# Altium footprint library HerosLib.PcbLib: 110 footprints (part 7 of 7)
Each footprint in its own frame and in the unit in brackets; x right, y up, seen from the top. Pads: shape width x height; smd on the part's side, far side on the other; paste and mask are expansions set on the pad; w line width, h text height; cw(c..) or ccw(c..) is an arc to the next point about the centre after c.
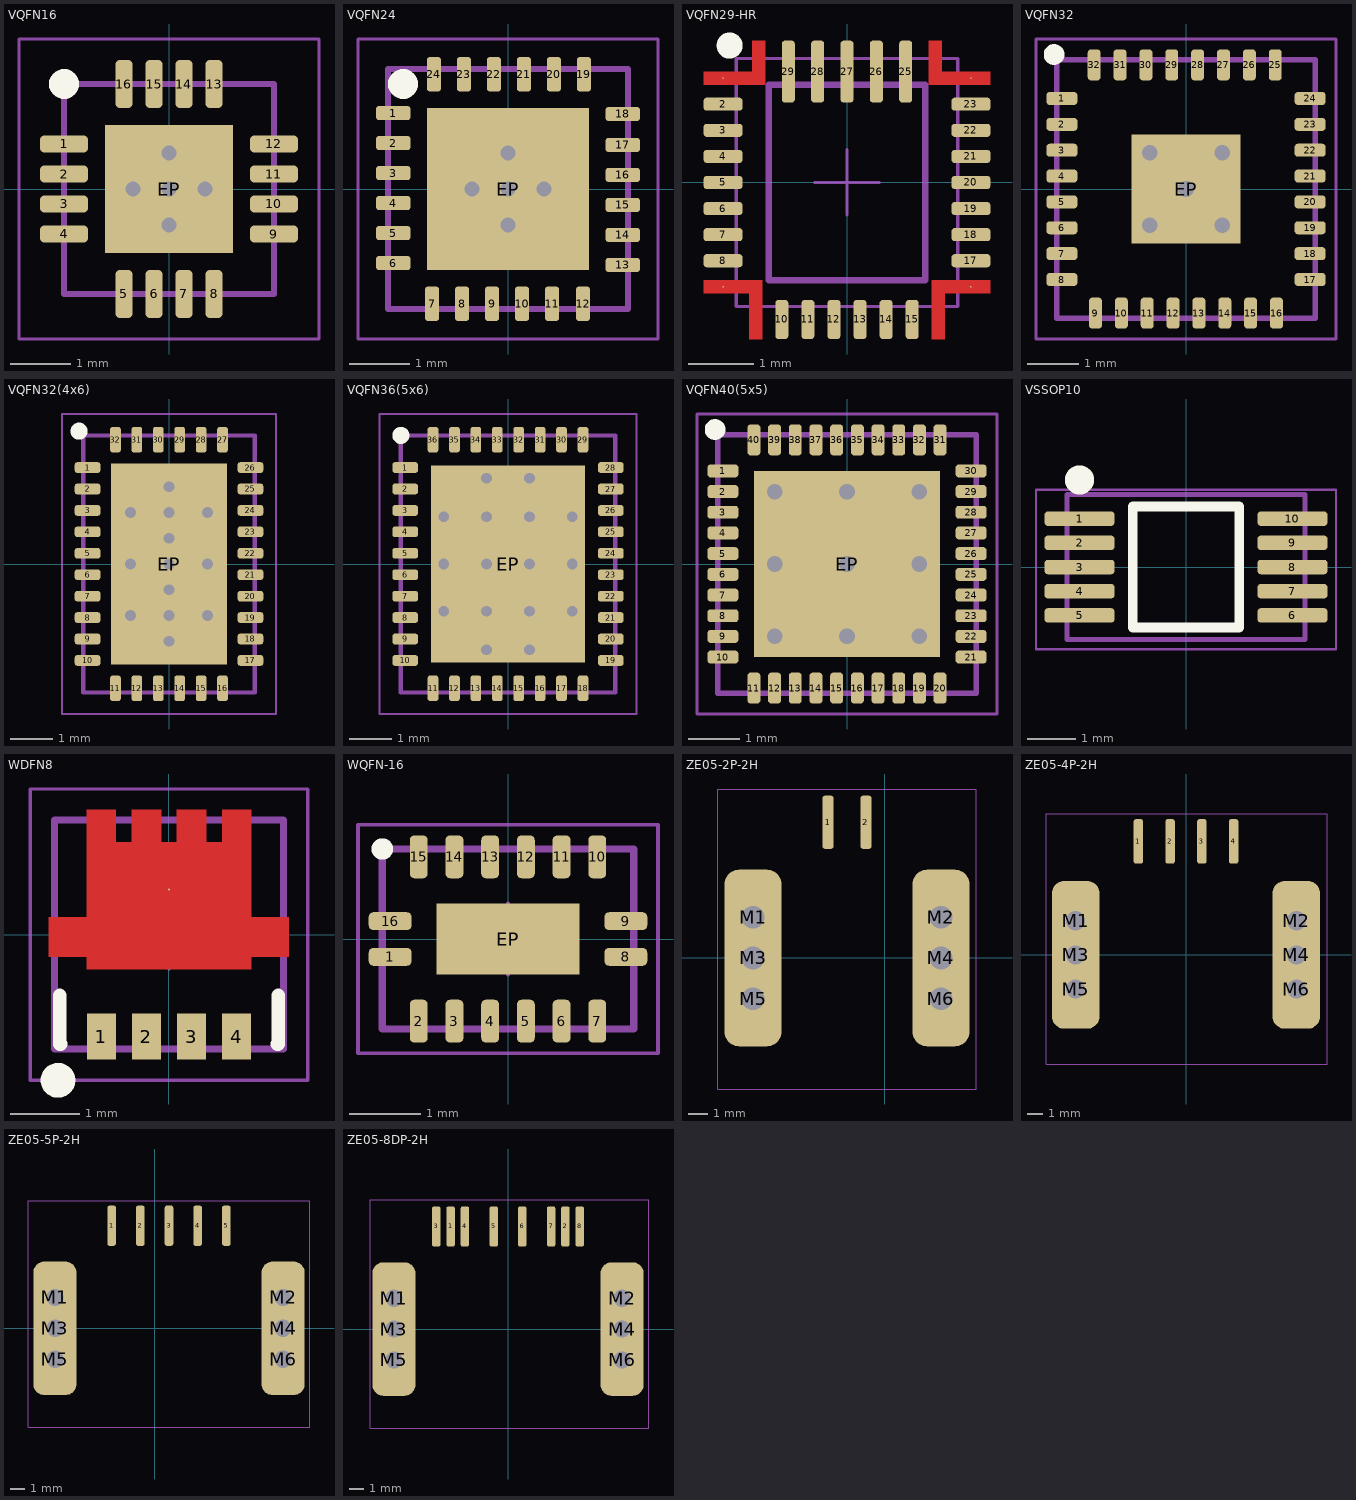
[diagram p6: the footprints below, top view; thin cyan lines are the x and y axes]

## VQFN16 [mm] "VQFN, 16-Leads, Body 3.5x3.5mm"
height 1.35
pads (17):
  rrect50% 0.8x0.28 smd: 1(-1.75,0.75) 2(-1.75,0.25) 3(-1.75,-0.25) 4(-1.75,-0.75) 9(1.75,-0.75) 10(1.75,-0.25) 11(1.75,0.25) 12(1.75,0.75)
  rrect50% 0.28x0.8 smd: 5(-0.75,-1.75) 6(-0.25,-1.75) 7(0.25,-1.75) 8(0.75,-1.75) 13(0.75,1.75) 14(0.25,1.75) 15(-0.25,1.75) 16(-0.75,1.75)
  rect 2.14x2.14 smd: EP(0,0)
via 0,-0.6 diameter 0.5 hole 0.25
via 0,0.6 diameter 0.5 hole 0.25
via -0.6,0 diameter 0.5 hole 0.25
via 0.6,0 diameter 0.5 hole 0.25
via 0,0 diameter 0.5 hole 0.25
Top Overlay:
  circle w0.25: c-1.75,1.75 r0.125
Mechanical 13:
  lines w0.1: -1.75,-1.75 -1.75,1.75 1.75,1.75 1.75,-1.75 -1.75,-1.75
Mechanical 15:
  lines w0.05: -0.5,0 0.5,0 ; 0,-0.5 0,0.5 ; -2.5,-2.5 -2.5,2.5 2.5,2.5 2.5,-2.5 -2.5,-2.5
3D body "User Library-VQFN 16-Pin 0_5mm Pitch RVA (S-PVQFN-N16).SLDPRT": height 1, standoff 0, extent -1.8,-1.8 1.8,1.8

## VQFN24 [mm] "VQFN, 16-Leads, Body 4x4mm"
height 1.35
pads (25):
  rrect50% 0.58x0.24 smd: 1(-1.913,1.266) 2(-1.913,0.766) 3(-1.913,0.266) 4(-1.913,-0.234) 5(-1.913,-0.734) 6(-1.913,-1.234) 13(1.913,-1.266) 14(1.913,-0.766) 15(1.913,-0.266) 16(1.913,0.234) 17(1.913,0.734) 18(1.913,1.25)
  rrect50% 0.24x0.58 smd: 7(-1.266,-1.913) 8(-0.766,-1.913) 9(-0.266,-1.913) 10(0.234,-1.913) 11(0.734,-1.913) 12(1.25,-1.913) 19(1.266,1.913) 20(0.766,1.913) 21(0.266,1.913) 22(-0.234,1.913) 23(-0.734,1.913) 24(-1.234,1.913)
  rect 2.7x2.7 smd: EP(0,0)
via 0,0 diameter 0.5 hole 0.25
via 0.6,0 diameter 0.5 hole 0.25
via -0.6,0 diameter 0.5 hole 0.25
via 0,0.6 diameter 0.5 hole 0.25
via 0,-0.6 diameter 0.5 hole 0.25
Top Overlay:
  circle w0.25: c-1.75,1.75 r0.125
Mechanical 13:
  lines w0.1: -2,-2 2,-2 2,2 -2,2 -2,-2
Mechanical 15:
  lines w0.05: -0.5,0 0.5,0 ; 0,-0.5 0,0.5 ; -2.5,-2.5 2.5,-2.5 2.5,2.5 -2.5,2.5 -2.5,-2.5
3D body "QFN 24.STEP": height 0.9, standoff 0, extent -2.07,-2.07 2.07,2.07

## VQFN29-HR [mm] "VQFN29, 32-Leads, Body 4x4mm"
height 1
pads (29):
  round 0.025 smd: 1(-1.9,1.6) 9(-1.9,-1.6) 16(1.9,-1.6) 24(1.9,1.6)
  rrect50% 0.6x0.2 smd: 2(-1.9,1.2) 3(-1.9,0.8) 4(-1.9,0.4) 5(-1.9,0) 6(-1.9,-0.4) 7(-1.9,-0.8) 8(-1.9,-1.2) 17(1.9,-1.2) 18(1.9,-0.8) 19(1.9,-0.4) 20(1.9,0) 21(1.9,0.4) 22(1.9,0.8) 23(1.9,1.2)
  rrect50% 0.2x0.6 smd: 10(-1,-2.1) 11(-0.6,-2.1) 12(-0.2,-2.1) 13(0.2,-2.1) 14(0.6,-2.1) 15(1,-2.1)
  rrect50% 0.2x0.95 smd: 25(0.9,1.7) 26(0.45,1.7) 27(0,1.7) 28(-0.45,1.7) 29(-0.9,1.7)
Top Layer:
  region: -2.2,-1.7 -1.5,-1.7 -1.5,-2.4 -1.3,-2.4 -1.3,-1.5 -2.2,-1.5
  region: 2.2,-1.7 1.5,-1.7 1.5,-2.4 1.3,-2.4 1.3,-1.5 2.2,-1.5
  region: -2.2,1.7 -1.45,1.7 -1.45,2.175 -1.25,2.175 -1.25,1.5 -2.2,1.5
  region: 2.2,1.7 1.45,1.7 1.45,2.175 1.25,2.175 1.25,1.5 2.2,1.5
Top Overlay:
  circle w0.2: c-1.8,2.1 r0.1
Mechanical 13:
  lines w0.1: -1.2,-1.5 -1.2,1.5 1.2,1.5 1.2,-1.5 -1.2,-1.5
Mechanical 15:
  lines w0.05: -0.5,0 0.5,0 ; 0,-0.5 0,0.5 ; -1.7,-1.9 -1.7,1.9 1.7,1.9 1.7,-1.9 -1.7,-1.9
3D body: height 1, standoff 0, extent -2,-2.1 2,1.9

## VQFN32 [mm] "VQFN, 32-Leads, Body 5x5mm"
height 1
pads (33):
  rrect50% 0.6x0.25 smd: 1(-2.4,1.75) 2(-2.4,1.25) 3(-2.4,0.75) 4(-2.4,0.25) 5(-2.4,-0.25) 6(-2.4,-0.75) 7(-2.4,-1.25) 8(-2.4,-1.75) 17(2.4,-1.75) 18(2.4,-1.25) 19(2.4,-0.75) 20(2.4,-0.25) 21(2.4,0.25) 22(2.4,0.75) 23(2.4,1.25) 24(2.4,1.75)
  rrect50% 0.25x0.6 smd: 9(-1.75,-2.4) 10(-1.25,-2.4) 11(-0.75,-2.4) 12(-0.25,-2.4) 13(0.25,-2.4) 14(0.75,-2.4) 15(1.25,-2.4) 16(1.75,-2.4) 25(1.725,2.4) 26(1.225,2.4) 27(0.725,2.4) 28(0.225,2.4) 29(-0.275,2.4) 30(-0.775,2.4) 31(-1.275,2.4) 32(-1.775,2.4)
  rect 2.1x2.1 smd paste-5: EP(0,0)
via 0,0 diameter 0.6 hole 0.3
via 0.7,-0.7 diameter 0.6 hole 0.3
via -0.7,0.7 diameter 0.6 hole 0.3
via 0.7,0.7 diameter 0.6 hole 0.3
via -0.7,-0.7 diameter 0.6 hole 0.3
Top Overlay:
  circle w0.2: c-2.55,2.6 r0.1
Top Paste:
  region: 1.05,-0.1 0.1,-0.1 0.1,-1.05 1.05,-1.05
  region: -0.1,-1.05 -0.1,-0.1 -1.05,-0.1 -1.05,-1.05
  region: 0.1,1.05 0.1,0.1 1.05,0.1 1.05,1.05
  rectangle: -1.05,0.1 -0.1,1.05
Mechanical 13:
  lines w0.1: -2.5,-2.5 2.5,-2.5 2.5,2.5 -2.5,2.5 -2.5,-2.5
Mechanical 15:
  lines w0.05: -0.5,0 0.5,0 ; 0,-0.5 0,0.5 ; -2.9,-2.9 2.9,-2.9 2.9,2.9 -2.9,2.9 -2.9,-2.9
3D body "User Library-QFN32-2.STEP": height 0.9, standoff 0, extent -2.505,-2.505 2.505,2.505

## VQFN32(4x6) [mm] "VQFN, 32-Leads, Body 4x6mm"
height 0.8
pads (33):
  rrect50% 0.6x0.25 smd: 1(-1.9,2.25) 2(-1.9,1.75) 3(-1.9,1.25) 4(-1.9,0.75) 5(-1.9,0.25) 6(-1.9,-0.25) 7(-1.9,-0.75) 8(-1.9,-1.25) 9(-1.9,-1.75) 10(-1.9,-2.25) 17(1.9,-2.25) 18(1.9,-1.75) 19(1.9,-1.25) 20(1.9,-0.75) 21(1.9,-0.25) 22(1.9,0.25) 23(1.9,0.75) 24(1.9,1.25) 25(1.9,1.75) 26(1.9,2.25)
  rrect50% 0.25x0.6 smd: 11(-1.25,-2.9) 12(-0.75,-2.9) 13(-0.25,-2.9) 14(0.25,-2.9) 15(0.75,-2.9) 16(1.25,-2.9) 27(1.25,2.9) 28(0.75,2.9) 29(0.25,2.9) 30(-0.25,2.9) 31(-0.75,2.9) 32(-1.25,2.9)
  rect 2.7x4.7 smd paste-5: EP(0,0)
via 0,1.8 diameter 0.5 hole 0.25
via 0,-1.8 diameter 0.5 hole 0.25
via 0,-1.2 diameter 0.5 hole 0.25
via 0,-0.6 diameter 0.5 hole 0.25
via 0,0 diameter 0.5 hole 0.25
via 0,0.6 diameter 0.5 hole 0.25
via 0,1.2 diameter 0.5 hole 0.25
via -0.9,0 diameter 0.5 hole 0.25
via 0.9,0 diameter 0.5 hole 0.25
via -0.9,1.2 diameter 0.5 hole 0.25
via 0.9,1.2 diameter 0.5 hole 0.25
via -0.9,-1.2 diameter 0.5 hole 0.25
via 0.9,-1.2 diameter 0.5 hole 0.25
Top Overlay:
  circle w0.2: c-2.1,3.1 r0.1
Top Paste:
  region: 0.35,-1.35 0.35,-2.3 1.3,-2.3 1.3,-1.35
  region: -1.3,-1.35 -1.3,-2.3 -0.35,-2.3 -0.35,-1.35
  region: -1.3,2.3 -1.3,1.35 -0.35,1.35 -0.35,2.3
  region: 0.35,2.3 0.35,1.35 1.3,1.35 1.3,2.3
  rectangle: -1.3,0.15 -0.35,1.1
  region: 0.35,1.1 0.35,0.15 1.3,0.15 1.3,1.1
  region: -0.35,-1.1 -0.35,-0.15 -1.3,-0.15 -1.3,-1.1
  region: 1.3,-0.15 0.35,-0.15 0.35,-1.1 1.3,-1.1
Mechanical 13:
  lines w0.1: -2,-3 -2,3 2,3 2,-3 -2,-3
Mechanical 15:
  lines w0.05: -0.5,0 0.5,0 ; 0,-0.5 0,0.5 ; -2.5,-3.5 -2.5,3.5 2.5,3.5 2.5,-3.5 -2.5,-3.5
3D body: height 0.9, standoff 0, extent -2,-3 2,3

## VQFN36(5x6) [mm] "VQFN, 32-Leads, Body 5x6mm"
height 1
pads (37):
  rrect50% 0.6x0.25 smd: 1(-2.4,2.25) 2(-2.4,1.75) 3(-2.4,1.25) 4(-2.4,0.75) 5(-2.4,0.25) 6(-2.4,-0.25) 7(-2.4,-0.75) 8(-2.4,-1.25) 9(-2.4,-1.75) 10(-2.4,-2.25) 19(2.4,-2.25) 20(2.4,-1.75) 21(2.4,-1.25) 22(2.4,-0.75) 23(2.4,-0.25) 24(2.4,0.25) 25(2.4,0.75) 26(2.4,1.25) 27(2.4,1.75) 28(2.4,2.25)
  rrect50% 0.25x0.6 smd: 11(-1.75,-2.9) 12(-1.25,-2.9) 13(-0.75,-2.9) 14(-0.25,-2.9) 15(0.25,-2.9) 16(0.75,-2.9) 17(1.25,-2.9) 18(1.75,-2.9) 29(1.75,2.9) 30(1.25,2.9) 31(0.75,2.9) 32(0.25,2.9) 33(-0.25,2.9) 34(-0.75,2.9) 35(-1.25,2.9) 36(-1.75,2.9)
  rect 3.6x4.6 smd paste-1.8: EP(0,0)
via -1.5,0 diameter 0.5 hole 0.25
via 0.5,0 diameter 0.5 hole 0.25
via -0.5,0 diameter 0.5 hole 0.25
via -0.5,1.1 diameter 0.5 hole 0.25
via 0.5,1.1 diameter 0.5 hole 0.25
via -0.5,-1.1 diameter 0.5 hole 0.25
via 0.5,-1.1 diameter 0.5 hole 0.25
via -1.5,-1.1 diameter 0.5 hole 0.25
via 1.5,-1.1 diameter 0.5 hole 0.25
via 1.5,0 diameter 0.5 hole 0.25
via -1.5,1.1 diameter 0.5 hole 0.25
via -0.5,2 diameter 0.5 hole 0.25
via 0.5,2 diameter 0.5 hole 0.25
via 1.5,1.1 diameter 0.5 hole 0.25
via 0.5,-2 diameter 0.5 hole 0.25
via -0.5,-2 diameter 0.5 hole 0.25
Top Overlay:
  circle w0.2: c-2.5,3 r0.1
Top Paste:
  rectangle: 0.6,-2.15 1.6,-1.15
  rectangle: 0.6,1.15 1.6,2.15
  rectangle: 0.6,0.05 1.6,1.05
  rectangle: 0.6,-1.05 1.6,-0.05
  rectangle: -1.6,-2.15 -0.6,-1.15
  rectangle: -1.6,1.15 -0.6,2.15
  rectangle: -1.6,0.05 -0.6,1.05
  rectangle: -1.6,-1.05 -0.6,-0.05
  rectangle: -0.5,-2.15 0.5,-1.15
  rectangle: -0.5,1.15 0.5,2.15
  rectangle: -0.5,0.05 0.5,1.05
  rectangle: -0.5,-1.05 0.5,-0.05
Mechanical 13:
  lines w0.1: -2.5,-3 2.5,-3 2.5,3 -2.5,3 -2.5,-3
Mechanical 15:
  lines w0.05: -3,-3.5 3,-3.5 3,3.5 -3,3.5 -3,-3.5
3D body "BQ25820RRVR.STEP": height 1, standoff 0, extent -2.5,-3 2.5,3

## VQFN40(5x5) [mm] "VQFN, 32-Leads, Body 5x5mm"
height 1
pads (41):
  rrect50% 0.6x0.25 smd: 1(-2.4,1.8) 2(-2.4,1.4) 3(-2.4,1) 4(-2.4,0.6) 5(-2.4,0.2) 6(-2.4,-0.2) 7(-2.4,-0.6) 8(-2.4,-1) 9(-2.4,-1.4) 10(-2.4,-1.8) 21(2.4,-1.8) 22(2.4,-1.4) 23(2.4,-1) 24(2.4,-0.6) 25(2.4,-0.2) 26(2.4,0.2) 27(2.4,0.6) 28(2.4,1) 29(2.4,1.4) 30(2.4,1.8)
  rrect50% 0.25x0.6 smd: 11(-1.8,-2.4) 12(-1.4,-2.4) 13(-1,-2.4) 14(-0.6,-2.4) 15(-0.2,-2.4) 16(0.2,-2.4) 17(0.6,-2.4) 18(1,-2.4) 19(1.4,-2.4) 20(1.8,-2.4) 31(1.8,2.4) 32(1.4,2.4) 33(1,2.4) 34(0.6,2.4) 35(0.2,2.4) 36(-0.2,2.4) 37(-0.6,2.4) 38(-1,2.4) 39(-1.4,2.4) 40(-1.8,2.4)
  rect 3.6x3.6 smd paste-1.8: EP(0,0)
via 0,0 diameter 0.6 hole 0.3
via -1.4,-1.4 diameter 0.6 hole 0.3
via 1.4,-1.4 diameter 0.6 hole 0.3
via 0,-1.4 diameter 0.6 hole 0.3
via 0,1.4 diameter 0.6 hole 0.3
via -1.4,1.4 diameter 0.6 hole 0.3
via -1.4,0 diameter 0.6 hole 0.3
via 1.4,0 diameter 0.6 hole 0.3
via 1.4,1.4 diameter 0.6 hole 0.3
Top Overlay:
  circle w0.2: c-2.55,2.6 r0.1
Top Paste:
  region: 1.3,-0.1 0.1,-0.1 0.1,-1.3 1.3,-1.3
  region: 0.1,1.3 0.1,0.15 1.3,0.15 1.3,1.3
  rectangle: -1.3,0.15 -0.1,1.3
  region: -0.1,-1.2 -0.1,-0.1 -1.3,-0.1 -1.3,-1.2
Mechanical 13:
  lines w0.1: -2.5,-2.5 2.5,-2.5 2.5,2.5 -2.5,2.5 -2.5,-2.5
Mechanical 15:
  lines w0.05: -0.5,0 0.5,0 ; 0,-0.5 0,0.5 ; -2.9,-2.9 2.9,-2.9 2.9,2.9 -2.9,2.9 -2.9,-2.9
3D body "User Library-QFN 40 5x5.STEP": height 0.73, standoff -0.02, extent -2.501,-2.501 2.501,2.501

## VSSOP10 [mm] "10-TFSOP, 10-MSOP (0.118\", 3.00mm Width)"
height 1.1
pads (10):
  rrect50% 1.45x0.3 smd mask+0.05: 1(-2.2,1) 2(-2.2,0.5) 3(-2.2,0) 4(-2.2,-0.5) 5(-2.2,-1) 6(2.2,-1) 7(2.2,-0.5) 8(2.2,0) 9(2.2,0.5) 10(2.2,1)
Top Overlay:
  circle w0.5: c-2.2,1.8 r0.05
  lines w0.2: -1.1,-1.25 1.1,-1.25 1.1,1.25 -1.1,1.25 -1.1,-1.25
Mechanical 13:
  lines w0.1: -2.463,-1.5 -2.463,1.5 2.463,1.5 2.463,-1.5 -2.463,-1.5
Mechanical 15:
  lines w0.05: -3.1,-1.7 -3.1,1.6 3.1,1.6 3.1,-1.7 -3.1,-1.7
3D body "User Library-DGS0010A.STEP": height 1.1, standoff 0, extent -2.463,-1.5 2.463,1.5

## WDFN8 [mm] "WDFN8 3.3x3.3mm"
height 0.75
pads (5):
  rect 0.42x0.66 smd paste+0 mask+0: 1(-0.975,-1.47) 2(-0.325,-1.47) 3(0.325,-1.47) 4(0.975,-1.47)
  round 0.025 smd: 5-8(0,0.65)
Top Layer:
  region: -1.73,-0.32 -1.185,-0.32 -1.185,-0.5 1.185,-0.5 1.185,-0.32 1.73,-0.32 1.73,0.25 1.185,0.25 1.185,1.8 0.765,1.8 0.765,1.33 0.535,1.33 0.535,1.8 0.115,1.8 0.115,1.33 -0.115,1.33 -0.115,1.8 -0.535,1.8 -0.535,1.33 -0.765,1.33 -0.765,1.8 -1.185,1.8 -1.185,0.25 -1.73,0.25
Top Overlay:
  circle w0.25: c-1.6,-2.1 r0.125
  lines w0.2: -1.575,-0.875 -1.575,-1.575 -1.56,-1.575 ; 1.56,-1.575 1.575,-1.575 1.575,-0.875
Top Assembly:
  lines w0.1: -1.65,-1.65 -1.65,1.65 1.65,1.65 1.65,-1.65 -1.65,-1.65
Mechanical 15:
  lines w0.05: -0.5,0 0.5,0 ; 0,-0.5 0,0.5 ; -2,-2.1 2,-2.1 2,2.1 -2,2.1 -2,-2.1
3D body "Trans_onsemi_NVTFS5C680NLWFTAG_eec.STEP": height 0.85, standoff 0, extent -1.65,-1.65 1.65,1.65

## WQFN-16 [mm] "WQFN - 3.5x0.5mm"
height 0.8
pads (17):
  rrect50% 0.6x0.25 smd: 1(-1.65,-0.25) 8(1.65,-0.25) 9(1.65,0.25) 16(-1.65,0.25)
  rrect50% 0.25x0.6 smd: 2(-1.25,-1.15) 3(-0.75,-1.15) 4(-0.25,-1.15) 5(0.25,-1.15) 6(0.75,-1.15) 7(1.25,-1.15) 10(1.25,1.15) 11(0.75,1.15) 12(0.25,1.15) 13(-0.25,1.15) 14(-0.75,1.15) 15(-1.25,1.15)
  rect 2x1 smd paste-2539.97: EP(0,0)
Top Overlay:
  circle w0.2: c-1.76,1.26 r0.05
Top Paste:
  rectangle: -0.3,-0.2 0.3,0.2
Mechanical 13:
  lines w0.1: -1.76,-1.26 1.76,-1.26 1.76,1.26 -1.76,1.26 -1.76,-1.26
Mechanical 15:
  lines w0.05: -0.5,0 0.5,0 ; 0,-0.5 0,0.5 ; -2.1,-1.6 2.1,-1.6 2.1,1.6 -2.1,1.6 -2.1,-1.6
3D body "User Library-WQFN-16.sldprt": height 0.82, standoff 0, extent -1.76,-1.26 1.76,1.26

## ZE05-2P-2H [mm]
height 8.34
pads (8):
  rrect50% 0.6x2.8 smd: 1(-3,7.15) 2(-1,7.15)
  rrect50% 3x5 hole 1.2: M1(-6.95,2.15) M2(2.95,2.15) M3(-6.95,0) M4(2.95,0) M5(-6.95,-2.15) M6(2.95,-2.15)
Mechanical 15:
  lines w0.05: -8.8,-6.9 4.8,-6.9 4.8,8.9 -8.8,8.9 -8.8,-6.9
3D body "õqÉŠŒp ZE05-2P-2H.stp": height 8.36, standoff -2.07, extent -8.16,-6.6 4.16,8.2

## ZE05-4P-2H [mm]
height 8.34
pads (10):
  rrect50% 0.6x2.8 smd: 1(-3,7.15) 2(-1,7.15) 3(1,7.15) 4(3,7.15)
  rrect50% 3x5 hole 1.2: M1(-6.95,2.15) M2(6.95,2.15) M3(-6.95,0) M4(6.95,0) M5(-6.95,-2.15) M6(6.95,-2.15)
Mechanical 15:
  lines w0.05: -8.8,-6.9 -8.8,8.9 8.9,8.9 8.9,-6.9 -8.8,-6.9
3D body "õqÉŠŒp ZE05-4P-2H.stp": height 8.36, standoff -2.07, extent -8.16,-6.6 8.16,8.2

## ZE05-5P-2H [mm]
height 8.34
pads (11):
  rrect50% 0.6x2.8 smd: 1(-3,7.15) 2(-1,7.15) 3(1,7.15) 4(3,7.15) 5(5,7.15)
  rrect50% 3x5 hole 1.2: M1(-6.95,2.15) M2(8.95,2.15) M3(-6.95,0) M4(8.95,0) M5(-6.95,-2.15) M6(8.95,-2.15)
Mechanical 15:
  lines w0.05: -8.8,-6.9 -8.8,8.9 10.8,8.9 10.8,-6.9 -8.8,-6.9
3D body "ZE05-5P-2H.stp": height 8.34, standoff -2.09, extent -8.16,-6.6 10.16,8.2

## ZE05-8DP-2H [mm]
height 8.34
pads (14):
  rrect50% 0.6x2.8 smd: 1(-4,7.15) 2(4,7.15) 3(-5,7.15) 4(-3,7.15) 5(-1,7.15) 6(1,7.15) 7(3,7.15) 8(5,7.15)
  rrect50% 3x5 hole 1.2: M1(-7.95,2.15) M2(7.95,2.15) M3(-7.95,0) M4(7.95,0) M5(-7.95,-2.15) M6(7.95,-2.15)
Mechanical 15:
  lines w0.05: -9.6,-6.9 9.8,-6.9 9.8,9 -9.6,9 -9.6,-6.9
3D body "õqÉŠŒpZE05-8DP-2H.stp": height 8.84, standoff -2.1, extent -9.26,-6.6 9.26,8.2